# Altium footprint library K66BLEZv1.0.PcbLib: 1 footprints
Each footprint in its own frame and in the unit in brackets; x right, y up, seen from the top. Pads: shape width x height; smd on the part's side, far side on the other; paste and mask are expansions set on the pad; w line width, h text height; cw(c..) or ccw(c..) is an arc to the next point about the centre after c.
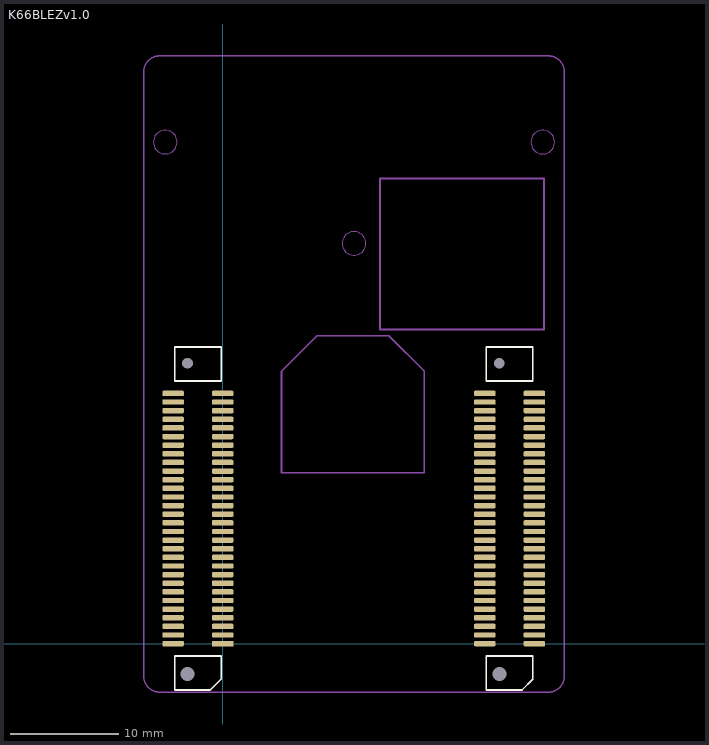
[diagram p0: the footprint, top view; thin cyan lines are the x and y axes]

## K66BLEZv1.0 [mm]
pads (124):
  rect 2x0.5 smd mask+0.06: A1(0,0)
  rrect50% 2x0.5 smd mask+0.06: A2(-4.6,0) A3(0,0.8) A4(-4.6,0.8) A5(0,1.6) A6(-4.6,1.6) A7(0,2.4) A8(-4.6,2.4) A9(0,3.2) A10(-4.6,3.2) A11(0,4) A12(-4.6,4) A13(0,4.8) A14(-4.6,4.8) A15(0,5.6) A16(-4.6,5.6) A17(0,6.4) A18(-4.6,6.4) A19(0,7.2) A20(-4.6,7.2) A21(0,8) A22(-4.6,8) A23(0,8.8) A24(-4.6,8.8) A25(0,9.6) A26(-4.6,9.6) A27(0,10.4) A28(-4.6,10.4) A29(0,11.2) A30(-4.6,11.2) A31(0,12) A32(-4.6,12) A33(0,12.8) A34(-4.6,12.8) A35(0,13.6) A36(-4.6,13.6) A37(0,14.4) A38(-4.6,14.4) A39(0,15.2) A40(-4.6,15.2) A41(0,16) A42(-4.6,16) A43(0,16.8) A44(-4.6,16.8) A45(0,17.6) A46(-4.6,17.6) A47(0,18.4) A48(-4.6,18.4) A49(0,19.2) A50(-4.6,19.2) A51(0,20) A52(-4.6,20) A53(0,20.8) A54(-4.6,20.8) A55(0,21.6) A56(-4.6,21.6) A57(0,22.4) A58(-4.6,22.4) A59(0,23.2) A60(-4.6,23.2) B1(28.9,0) B2(24.3,0) B3(28.9,0.8) B4(24.3,0.8) B5(28.9,1.6) B6(24.3,1.6) B7(28.9,2.4) B8(24.3,2.4) B9(28.9,3.2) B10(24.3,3.2) B11(28.9,4) B12(24.3,4) B13(28.9,4.8) B14(24.3,4.8) B15(28.9,5.6) B16(24.3,5.6) B17(28.9,6.4) B18(24.3,6.4) B19(28.9,7.2) B20(24.3,7.2) B21(28.9,8) B22(24.3,8) B23(28.9,8.8) B24(24.3,8.8) B25(28.9,9.6) B26(24.3,9.6) B27(28.9,10.4) B28(24.3,10.4) B29(28.9,11.2) B30(24.3,11.2) B31(28.9,12) B32(24.3,12) B33(28.9,12.8) B34(24.3,12.8) B35(28.9,13.6) B36(24.3,13.6) B37(28.9,14.4) B38(24.3,14.4) B39(28.9,15.2) B40(24.3,15.2) B41(28.9,16) B42(24.3,16) B43(28.9,16.8) B44(24.3,16.8) B45(28.9,17.6) B46(24.3,17.6) B47(28.9,18.4) B48(24.3,18.4) B49(28.9,19.2) B50(24.3,19.2) B51(28.9,20) B52(24.3,20) B53(28.9,20.8) B54(24.3,20.8) B55(28.9,21.6) B56(24.3,21.6) B57(28.9,22.4) B58(24.3,22.4) B59(28.9,23.2) B60(24.3,23.2)
  round 0 hole 1 unplated paste+0: TH1(-3.25,26) TH3(25.651,26)
  round 0 hole 1.3 unplated: TH2(-3.25,-2.8) TH4(25.65,-2.8)
Top Overlay:
  lines w0.15: -4.45,-4.3 -1.15,-4.3 -0.15,-3.3 -0.15,-1.15 -4.45,-1.15 -4.45,-4.3 ; -4.45,24.35 -0.15,24.35 -0.15,27.5 -4.45,27.5 -4.45,24.35 ; 24.45,-4.3 27.75,-4.3 28.75,-3.3 28.75,-1.15 24.45,-1.15 24.45,-4.3 ; 24.45,24.35 28.75,24.35 28.75,27.5 24.45,27.5 24.45,24.35
Mechanical 2:
  circle w0.1: c29.675,46.5 r1.1
  circle w0.1: c-5.325,46.5 r1.1
  circle w0.1: c12.175,37.1 r1.1
  lines w0.15: -7.325,-3 ccw(c-5.825,-3) -5.825,-4.5 30.175,-4.5 ccw(c30.175,-3) 31.675,-3 31.675,53 ccw(c30.175,53) 30.175,54.5 -5.825,54.5 ccw(c-5.825,53) -7.325,53 -7.325,-3 ; 5.455,15.834 18.675,15.834 18.675,25.275 15.4,28.55 8.75,28.55 5.455,25.255 5.455,15.834 ; 14.583,29.126 14.583,43.126 29.787,43.126 29.787,29.126 14.583,29.126
3D body "K66BLEZv1.STEP": height 10.24, standoff -0.89, extent -7.325,-4.5 31.675,54.532